# Altium footprint library Footprint-Lib-PhilsLab.PcbLib: 210 footprints (part 1 of 14)
Each footprint in its own frame and in the unit in brackets; x right, y up, seen from the top. Pads: shape width x height; smd on the part's side, far side on the other; paste and mask are expansions set on the pad; w line width, h text height; cw(c..) or ccw(c..) is an arc to the next point about the centre after c.
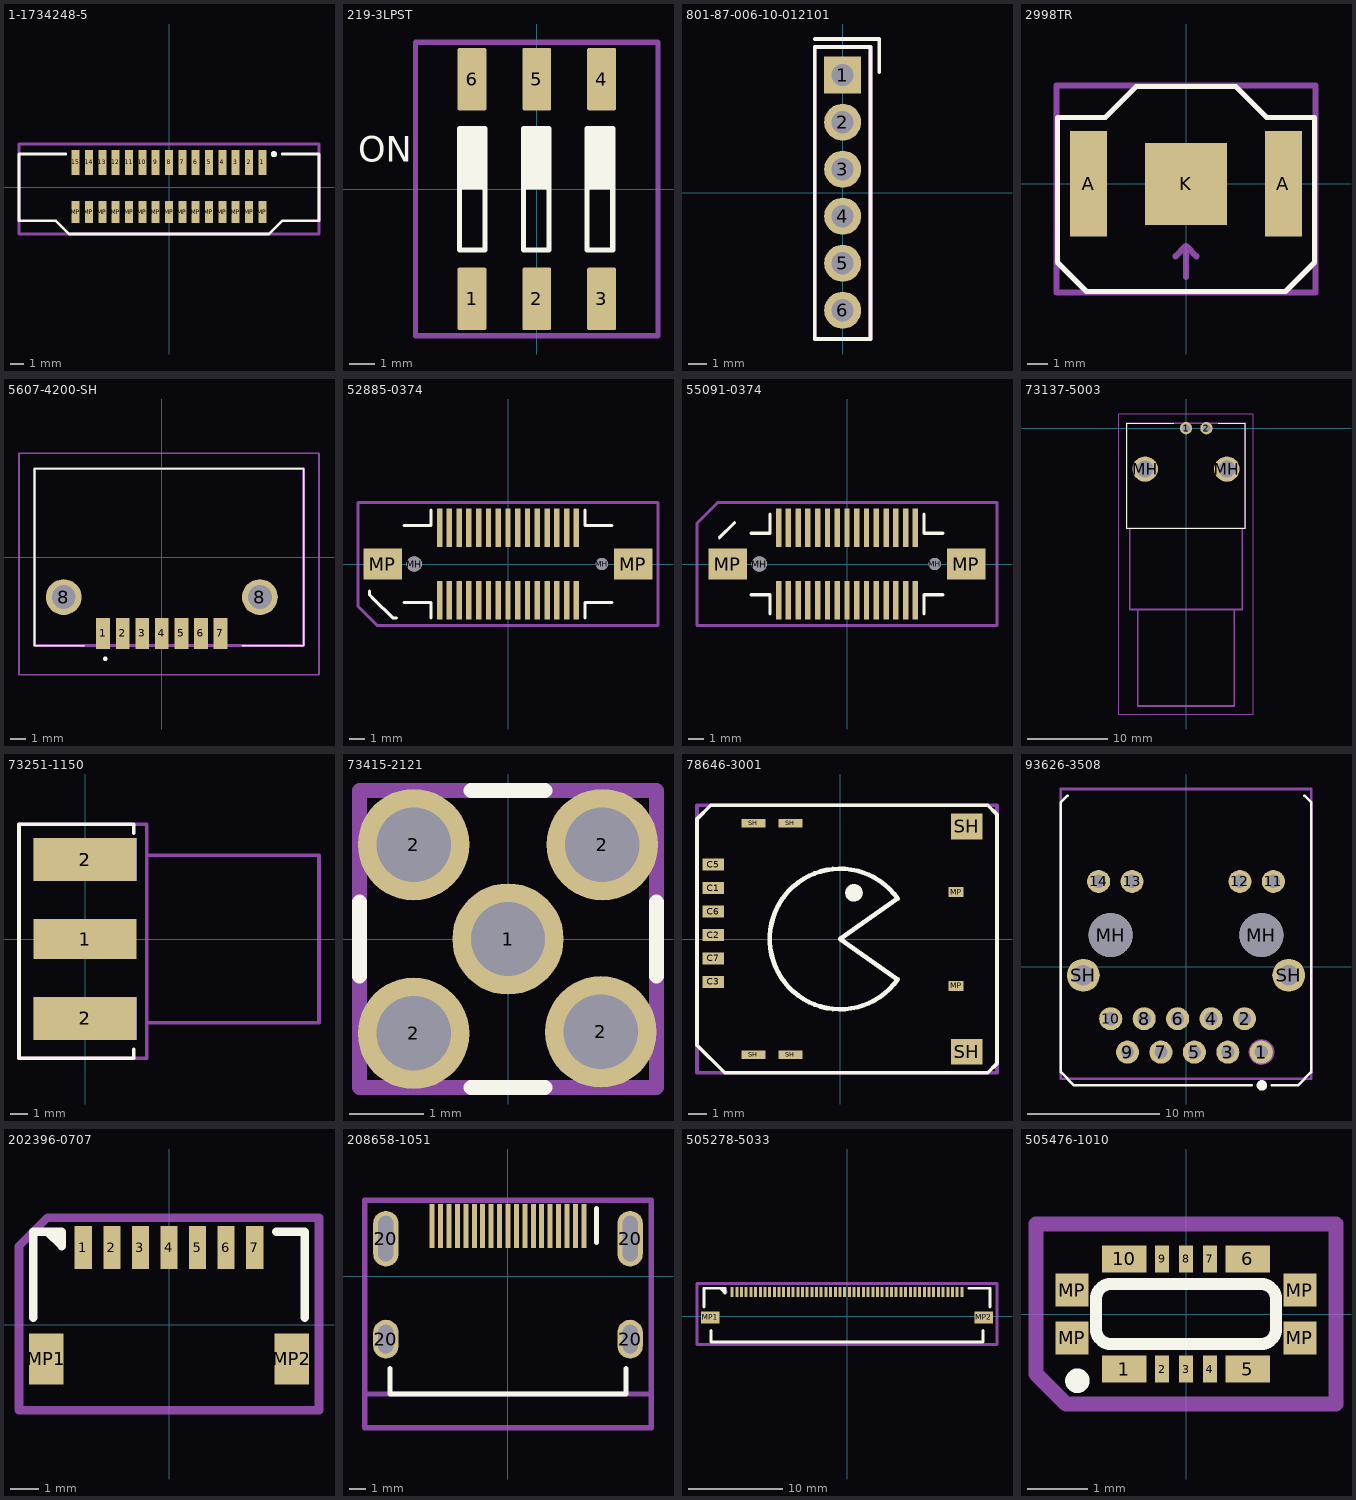
[diagram p0: the footprints below, top view; thin cyan lines are the x and y axes]

## 1-1734248-5 [mm]
pads (30):
  rect 0.6x1.85 smd: 1(7,1.863) 2(6,1.863) 3(5,1.863) 4(4,1.863) 5(3,1.863) 6(2,1.863) 7(1,1.863) 8(0,1.863) 9(-1,1.863) 10(-2,1.863) 11(-3,1.863) 12(-4,1.863) 13(-5,1.863) 14(-6,1.863) 15(-7,1.863)
  rect 0.6x1.65 smd: MP(-7,-1.862) MP(-6,-1.862) MP(-5,-1.862) MP(-4,-1.862) MP(-3,-1.862) MP(-2,-1.862) MP(-1,-1.862) MP(0,-1.862) MP(1,-1.862) MP(2,-1.862) MP(3,-1.862) MP(4,-1.862) MP(5,-1.862) MP(6,-1.862) MP(7,-1.862)
Top Overlay:
  circle w0.25: c7.866,2.49 r0.107
  lines w0.2: -7.75,2.5 -11.25,2.5 -11.25,-2.5 -8.5,-2.5 -7.5,-3.5 7.5,-3.5 8.5,-2.5 11.25,-2.5 11.25,2.5 8.5,2.5
Mechanical 13:
  circle w0.25: c7.871,2.497 r0.102
  lines w0.2: -11.25,-3.5 11.25,-3.5 11.25,3.25 -7.5,3.25 -11.25,3.25 -11.25,-3.5
  text "'.Designator'" at -5.84,-0.925 h1
3D body "1-1734248-5.stp": height 5.69, standoff 0.01, extent -11.2,-2.45 11.2,2.4

## 219-3LPST [mm]
pads (6):
  rrect10% 1.13x2.44 smd mask+0: 1(-2.54,-4.305) 2(0,-4.305) 3(2.54,-4.305) 4(2.54,4.305) 5(0,4.305) 6(-2.54,4.305)
Top Overlay:
  region: 1.975,2.365 2.975,2.365 2.975,-0.01 1.975,-0.01
  region: -0.525,2.365 0.475,2.365 0.475,-0.01 -0.525,-0.01
  region: -3.025,2.365 -2.025,2.365 -2.025,-0.01 -3.025,-0.01
  lines w0.2: -3.025,-2.385 -2.025,-2.385 -2.025,2.365 -3.025,2.365 -3.025,-2.385 ; -0.525,-2.385 0.475,-2.385 0.475,2.365 -0.525,2.365 -0.525,-2.385 ; 1.975,-2.385 2.975,-2.385 2.975,2.365 1.975,2.365 1.975,-2.385
  text "ON" at -7.008,1.075 h1
Mechanical 13:
  lines w0.2: -4.75,-5.75 4.75,-5.75 4.75,-5.25 4.75,5.75 -4.75,5.75 -4.75,-5.75
  text "'.Designator'" at -5.84,-0.925 h1
3D body "219-3poles.stp": height 4.31, standoff 0.01, extent -4.545,-4.955 4.545,4.955

## 801-87-006-10-012101 [mm]
pads (6):
  rect 2x2 hole 1.2 mask+0.07: 1(0,6.35)
  round 2 hole 1.2 mask+0.07: 2(0,3.81) 3(0,1.27) 4(0,-1.27) 5(0,-3.81) 6(0,-6.35)
Top Overlay:
  lines w0.2: -1.5,8.3 1.972,8.3 1.972,6.5 ; -1.5,-7.9 -1.5,7.863 1.5,7.863 1.5,-7.9 -1.5,-7.9
Mechanical 13:
  circle w0.25: c-0.012,6.336 r0.823
  lines w0.2: -1.5,-7.9 -1.5,7.864 1.5,7.864 1.5,-7.9 -1.5,-7.9
  text "'.Designator'" at -5.84,-0.925 h1
3D body "801-87-006-10-012101.stp": height 4.21, standoff -3.17, extent -1.27,-7.62 1.27,7.62

## 2998TR [mm] "6.8mm Coin Cell Holder SMD"
height 3.05
pads (3):
  rect 1.78x5.08 smd: A(-4.7,0) A(4.7,0)
  rect 3.96x3.96 smd: K(0,0)
Top Overlay:
  lines w0.25: -6.2,-3.8 -6.2,3.2 -3.9,3.2 -2.4,4.7 2.4,4.7 3.9,3.2 6.2,3.2 6.2,-3.8 4.8,-5.2 -4.8,-5.2 -6.2,-3.8
Mechanical 13:
  lines w0.25: -5.25,-1.25 -4.25,-1.25 ; -4.75,-1.75 -4.75,-0.75 ; -0.5,-1.25 0.5,-1.25 ; 4.25,-1.25 5.25,-1.25 ; 4.75,-1.75 4.75,-0.75 ; -6.2,-3.8 -6.2,3.2 -3.9,3.2 -2.4,4.7 2.4,4.7 3.9,3.2 6.2,3.2 6.2,-3.8 4.8,-5.2 -4.8,-5.2 -6.2,-3.8
  lines w0.3: 0,-4.5 0,-3 ; 0.5,-3.5 0,-3 ; -0.5,-3.5 0,-3 ; -0.5,-3.5 -0.5,-3.5 ; 0,-3 0,-3 ; -6.25,-5.25 6.25,-5.25 6.25,4.75 -6.25,4.75 -6.25,-5.25
  text "'.Designator'" at -5.665,-0.417 h1
3D body "2998TR.STEP": height 3.06, standoff 0.01, extent -5.357,-3.968 5.357,4.033

## 5607-4200-SH [mm]
pads (9):
  rect 0.9x2 smd: 1(-3.81,-4.96) 2(-2.54,-4.96) 3(-1.27,-4.96) 4(0,-4.96) 5(1.27,-4.96) 6(2.54,-4.96) 7(3.81,-4.96)
  round 2.325 hole 1.55: 8(-6.37,-2.6) 8(6.37,-2.6)
Top Overlay:
  lines w0.1: -8.275,5.75 9.21,5.75 ; -8.275,5.75 9.21,5.75 ; -8.275,5.75 -8.26,5.75 -8.26,-5.75 ; -8.275,5.75 -8.275,-5.75 -8.26,-5.75 ; -8.26,-5.75 -5.025,-5.75 -8.26,-5.75 ; 9.21,-5.75 5.225,-5.75 9.21,-5.75 ; 9.21,-5.75 9.21,5.75 ; 9.21,-5.75 9.21,5.75
  lines w0.2: -3.725,-6.6 cw(c-3.675,-6.6) -3.625,-6.6 ; -3.725,-6.6 ccw(c-3.675,-6.6) -3.625,-6.6 ; -3.725,-6.6 cw(c-3.675,-6.6) -3.625,-6.6
Mechanical 13:
  lines w0.2: -8.26,-5.75 9.21,-5.75 9.21,5.75 -8.26,5.75 -8.26,-5.75
  text "'.Designator'" at -5.84,-0.925 h1
Mechanical 15:
  lines w0.1: -9.275,-7.65 -9.275,6.75 10.21,6.75 10.21,-7.65 -9.275,-7.65
3D body "5607-4200-SH.stp": height 4.1, standoff -5, extent -8.26,-5.87 9.21,5.75

## 52885-0374 [mm]
pads (34):
  rect 0.35x2.5 smd mask+0.05: 1(-4.445,-2.35) 2(-3.81,-2.35) 3(-3.175,-2.35) 4(-2.54,-2.35) 5(-1.905,-2.35) 6(-1.27,-2.35) 7(-0.635,-2.35) 8(0,-2.35) 9(0.635,-2.35) 10(1.27,-2.35) 11(1.905,-2.35) 12(2.54,-2.35) 13(3.175,-2.35) 14(3.81,-2.35) 15(4.445,-2.35) 16(4.445,2.35) 17(3.81,2.35) 18(3.175,2.35) 19(2.54,2.35) 20(1.905,2.35) 21(1.27,2.35) 22(0.635,2.35) 23(0,2.35) 24(-0.635,2.35) 25(-1.27,2.35) 26(-1.905,2.35) 27(-2.54,2.35) 28(-3.175,2.35) 29(-3.81,2.35) 30(-4.445,2.35)
  round 1 hole 1 unplated: MH(-6.1,0)
  round 0.8 hole 0.8 unplated: MH(6.1,0)
  rect 2.5x2 smd mask+0.05: MP(-8.15,0) MP(8.15,0)
Top Overlay:
  lines w0.2: -9,-1.75 -9,-2 -8.75,-2.25 -7.5,-3.5 -7.25,-3.5 ; -6.75,-2.5 -5,-2.5 -5,-3.5 ; -6.75,2.5 -5,2.5 -5,3.5 ; 5,-3.5 5,-2.5 6.75,-2.5 ; 5,3.5 5,2.5 6.75,2.5
Mechanical 13:
  lines w0.2: -9.75,-2.75 -8.5,-4 9.75,-4 9.75,4 9.5,4 -9.75,4 -9.75,0 -9.75,-2.75
  text "'.Designator'" at -7.231,-1.087 h1.25
3D body "528850374.stp": height 4.21, standoff -0.59, extent -8.7,-3.2 8.7,3.2

## 55091-0374 [mm]
pads (34):
  rect 0.35x2.5 smd mask+0.05: 1(-4.445,2.35) 2(-3.81,2.35) 3(-3.175,2.35) 4(-2.54,2.35) 5(-1.905,2.35) 6(-1.27,2.35) 7(-0.635,2.35) 8(0,2.35) 9(0.635,2.35) 10(1.27,2.35) 11(1.905,2.35) 12(2.54,2.35) 13(3.175,2.35) 14(3.81,2.35) 15(4.445,2.35) 16(4.445,-2.35) 17(3.81,-2.35) 18(3.175,-2.35) 19(2.54,-2.35) 20(1.905,-2.35) 21(1.27,-2.35) 22(0.635,-2.35) 23(0,-2.35) 24(-0.635,-2.35) 25(-1.27,-2.35) 26(-1.905,-2.35) 27(-2.54,-2.35) 28(-3.175,-2.35) 29(-3.81,-2.35) 30(-4.445,-2.35)
  round 1 hole 1 unplated: MH(-5.7,0)
  round 0.8 hole 0.8 unplated: MH(5.7,0)
  rect 2.5x2 smd mask+0.05: MP(-7.75,0) MP(7.75,0)
Top Overlay:
  lines w0.2: -8.3,1.7 -7.3,2.7 ; -6.25,-2 -5,-2 -5,-3.25 ; -6.25,2 -5,2 -5,3.25 ; 5,-3.25 5,-2 6.25,-2 ; 5,3.25 5,2 6.25,2
Mechanical 13:
  lines w0.2: -9.75,-4 -9.75,0 -9.75,2.65 -8.4,4 9.5,4 9.75,4 9.75,-4 -9.75,-4
  text "'.Designator'" at -7.231,-1.087 h1.25
3D body "550910374.stp": height 5.21, standoff -0.59, extent -8.2,-2.6 8.2,2.6

## 73137-5003 [mm]
pads (4):
  round 1.54 hole 0.99: 1(0,0) 2(2.54,0)
  round 3.165 hole 2.11: MH(-5.08,-5.08) MH(5.08,-5.08)
Top Overlay:
  lines w0.1: -1.5,0.64 -7.38,0.64 -7.38,-12.44 7.38,-12.44 7.38,0.64 4,0.64
Mechanical 13:
  lines w0.2: -7.38,-12.44 -7.38,0.64 7.38,0.64 7.38,-12.44 -7.38,-12.44 ; -7,-22.54 -7,-12.44 7,-12.44 7,-22.54 -7,-22.54 ; -6,-34.54 -6,-22.54 6,-22.54 6,-34.54 -6,-34.54
  text "'.Designator'" at -6.315,-6.4 h1
Mechanical 15:
  lines w0.1: -8.38,-35.54 -8.38,1.77 8.38,1.77 8.38,-35.54 -8.38,-35.54
3D body "73137-5003.stp": height 12.51, standoff -4.84, extent -7.38,-33.18 7.38,2

## 73251-1150 [mm]
pads (5):
  rect 5.84x2.29 smd: 1(0,0)
  rect 5.84x2.42 smd: 2(0,-4.5) 2(0,4.5)
  rect 5.84x2.42 smd far side: 2(0,-4.5) 2(0,4.5)
Top Overlay:
  lines w0.2: 2.75,-6.25 2.75,-6.75 ; 2.75,6 2.75,6.5 ; 2.75,-6.75 ccw(c2.75,-6.75) 2.75,-6.75 ; 2.75,-6.75 -3.75,-6.75 -3.75,6.5 2.75,6.5 ; 2.75,6.5 ccw(c2.75,6.5) 2.75,6.5
Mechanical 13:
  lines w0.2: 3.5,-4.75 13.25,-4.75 13.25,4.75 3.5,4.75 ; -3.75,-6.75 -3.75,6.5 3.5,6.5 3.5,-6.75 -3.75,-6.75
  text "'.Designator'" at -5.665,-0.417 h1
  text "PCB EDGE" at 4.15,2.1 h0.3
3D body "732511150.stp": height 4.36, standoff -3.57, extent -1.137,-4.75 13.137,4.775

## 73415-2121 [mm]
pads (5):
  round 1.5 hole 1 mask+0.07: 1(0,0) 2(-1.27,-1.27) 2(-1.27,1.27) 2(1.25,-1.25) 2(1.27,1.27)
Top Overlay:
  lines w0.2: -2,-0.5 -2,0.5 ; -0.5,-2 0.5,-2 ; -0.5,2 0.5,2 ; 2,-0.5 2,0.5
Mechanical 13:
  lines w0.2: -2,-2 2,-2 2,2 -2,2 -2,-2
  text "'.Designator'" at -5.665,-0.417 h1
3D body "734152121.stp": height 4.73, standoff -2.76, extent -1.725,-1.725 1.725,1.725

## 78646-3001 [mm]
pads (14):
  rect 1.15x0.65 smd: C1(-6.865,2.755) C2(-6.865,0.215) C3(-6.865,-2.325) C5(-6.865,4.025) C6(-6.865,1.485) C7(-6.865,-1.055)
  rect 0.8x0.54 smd: MP(6.285,-2.54) MP(6.285,2.54)
  rect 1.3x0.45 smd: SH(-4.695,-6.27) SH(-4.695,6.27) SH(-2.695,-6.27) SH(-2.695,6.27)
  rect 1.7x1.4 smd: SH(6.865,-6.11) SH(6.865,6.1)
Top Overlay:
  circle w0.254: c0.75,2.5 r0.354
  circle w0.254: c0.75,2.5 r0.198
  lines w0.2: -7.75,-5.75 -7.75,5 -7.75,6.5 -7,7.25 8,7.25 8.5,6.75 8.5,-6.75 8,-7.25 -6.25,-7.25 -7.75,-5.75
  lines w0.25: 3.119,-2.184 0,0 3.119,2.184
  lines w0.254: 0.855,2.522 ccw(c0.75,2.5) 0.857,2.5 ; 3.119,-2.184 cw(c0,0) 3.119,2.184
Mechanical 13:
  lines w0.2: -7.75,-7.25 -7.75,-2.25 -7.75,7.25 8.5,7.25 8.5,-7.25 -7.75,-7.25
  text "'.Designator'" at -5.815,-0.9 h1
3D body "786463001.stp": height 1.46, standoff 0.01, extent -7.304,-6.556 8.146,6.494

## 93626-3508 [mm]
pads (18):
  round 1.75 hole 1: 1(5.715,-6.48) 2(4.445,-3.94) 3(3.175,-6.48) 4(1.905,-3.94) 5(0.635,-6.48) 6(-0.635,-3.94) 7(-1.905,-6.48) 8(-3.175,-3.94) 9(-4.445,-6.48) 10(-5.715,-3.94)
  round 1.75 hole 1.02: 11(6.635,6.48) 12(4.095,6.48) 13(-4.095,6.48) 14(-6.635,6.48)
  round 3.34 hole 3.34 unplated: MH(-5.715,2.41) MH(5.715,2.41)
  round 2.5 hole 1.58: SH(-7.795,-0.64) SH(7.795,-0.64)
Top Overlay:
  circle w0.25: c5.764,-9.001 r0.113
  circle w0.25: c5.764,-9.001 r0.277
  lines w0.2: -9,13 -9.5,12.5 -9.5,-8 -8.5,-9 5,-9 ; 6.5,-9 8.5,-9 9.5,-8 9.5,12.5 9,13
Mechanical 13:
  circle w0.25: c5.735,-6.476 r0.854
  lines w0.2: -9.5,-8.5 9.5,-8.5 9.5,13.5 -9.5,13.5 -9.5,-2 -9.5,-8.5
  text "'.Designator'" at -5.84,-0.925 h1
3D body "93626-3508.stp": height 15.21, standoff -3.29, extent -9.069,-8.14 9.089,13.23

## 202396-0707 [mm]
pads (9):
  rect 0.6x1.5 smd: 1(-3,2.7) 2(-2,2.7) 3(-1,2.7) 4(0,2.7) 5(1,2.7) 6(2,2.7) 7(3,2.7)
  rect 1.2x1.8 smd: MP1(-4.3,-1.2) MP2(4.3,-1.2)
Top Overlay:
  lines w0.3: -4.75,0.25 -4.75,3.25 -3.75,3.25 -3.75,2.75 ; -4.25,3.25 -3.75,2.75 ; 3.75,3.25 4.75,3.25 4.75,0.25 ; -3.75,2.75 -3.75,2.75 ; -3.75,2.75 -3.75,2.75
Mechanical 13:
  lines w0.3: -5.25,-3 -5.25,2.75 -4.25,3.75 5.25,3.75 5.25,-3 -5.25,-3
  text "'.Designator'" at -5.84,-0.925 h1
3D body "202396-0707.stp": height 4.71, standoff 0.01, extent -4.5,-2.725 4.5,3.175

## 208658-1051 [mm]
pads (23):
  rect 0.3x2.6 smd mask+0.07: 1(4.5,2.98) 2(4,2.98) 3(3.5,2.98) 4(3,2.98) 5(2.5,2.98) 6(2,2.98) 7(1.5,2.98) 8(1,2.98) 9(0.5,2.98) 10(0,2.98) 11(-0.5,2.98) 12(-1,2.98) 13(-1.5,2.98) 14(-2,2.98) 15(-2.5,2.98) 16(-3,2.98) 17(-3.5,2.98) 18(-4,2.98) 19(-4.5,2.98)
  oval 1.5x2.3 hole 0.9 slot 1.7 at 90 deg mask+0.07: 20(-7.25,-3.74) 20(7.25,-3.74)
  oval 1.5x3.3 hole 0.9 slot 2.7 at 90 deg mask+0.07: 20(-7.25,2.22) 20(7.25,2.22)
Top Overlay:
  lines w0.3: -7,-5.5 -7,-7 7,-7 7,-5.5 ; 5.25,2 5.25,4
Mechanical 13:
  lines w0.3: -8.5,-7 8.5,-7 ; -8.5,-9 8.5,-9 8.5,4.5 -8.5,4.5 -8.5,-4.5 -8.5,-9
  text "'.Designator'" at -5.84,-0.925 h1
3D body "208658-1051.stp": height 6.19, standoff -2.61, extent -7.497,-8.548 7.506,3.887

## 505278-5033 [mm]
pads (52):
  rect 0.325x1.05 smd mask+0.05: 1(-12.25,2.613) 2(-11.75,2.613) 3(-11.25,2.613) 4(-10.75,2.613) 5(-10.25,2.613) 6(-9.75,2.613) 7(-9.25,2.613) 8(-8.75,2.613) 9(-8.25,2.613) 10(-7.75,2.613) 11(-7.25,2.613) 12(-6.75,2.613) 13(-6.25,2.613) 14(-5.75,2.613) 15(-5.25,2.613) 16(-4.75,2.613) 17(-4.25,2.613) 18(-3.75,2.613) 19(-3.25,2.613) 20(-2.75,2.613) 21(-2.25,2.613) 22(-1.75,2.613) 23(-1.25,2.613) 24(-0.75,2.613) 25(-0.25,2.613) 26(0.25,2.613) 27(0.75,2.613) 28(1.25,2.613) 29(1.75,2.613) 30(2.25,2.613) 31(2.75,2.613) 32(3.25,2.613) 33(3.75,2.613) 34(4.25,2.613) 35(4.75,2.613) 36(5.25,2.613) 37(5.75,2.613) 38(6.25,2.613) 39(6.75,2.613) 40(7.25,2.613) 41(7.75,2.613) 42(8.25,2.613) 43(8.75,2.613) 44(9.25,2.613) 45(9.75,2.613) 46(10.25,2.613) 47(10.75,2.613) 48(11.25,2.613) 49(11.75,2.613) 50(12.25,2.613)
  rect 2x1.3 smd mask+0.07: MP1(-14.575,-0.112) MP2(14.575,-0.112)
Top Overlay:
  lines w0.3: -15.25,1 -15.25,3 -13,3 -13,2.5 -13.5,3 ; -14.5,-1.5 -14.5,-2.75 14.5,-2.75 14.5,-1.5 ; 13,3 15.25,3 15.25,1
Mechanical 13:
  circle w0.254: c-13.025,2.596 r0.127
  lines w0.3: -16,-3 -16,3.5 16,3.5 16,-3 -16,-3
  text "'.Designator'" at -5.84,-0.925 h1
3D body "505278-5033.stp": height 1.91, standoff 0.01, extent -15.25,-2.513 15.25,2.787

## 505476-1010 [mm]
pads (14):
  rect 0.74x0.45 smd: 1(-1.03,-0.92) 5(1.03,-0.92) 6(1.03,0.92) 10(-1.03,0.92)
  rect 0.24x0.45 smd: 2(-0.4,-0.92) 3(0,-0.92) 4(0.4,-0.92) 7(0.4,0.92) 8(0,0.92) 9(-0.4,0.92)
  rect 0.55x0.55 smd mask+0.15: MP(-1.9,-0.4) MP(-1.9,0.4) MP(1.9,-0.4) MP(1.9,0.4)
Top Overlay:
  circle w0.254: c-1.81,-1.113 r0.077
  lines w0.2: -1.5,-0.25 ccw(c-1.25,-0.25) -1.25,-0.5 1.25,-0.5 ccw(c1.25,-0.25) 1.5,-0.25 1.5,0.25 ccw(c1.25,0.25) 1.25,0.5 -1,0.5 -1.125,0.5 -1.25,0.5 ccw(c-1.25,0.25) -1.5,0.25 -1.5,-0.25
Mechanical 13:
  lines w0.25: -2.5,-1 -2,-1.5 2.5,-1.5 2.5,1.5 -2.5,1.5 -2.5,-1
  text "'.Designator'" at -5.815,-0.9 h1
3D body "5054761010.stp": height 0.51, standoff 0.01, extent -2.07,-1 2.07,1